# Altium footprint library SensorCard.PcbLib: 61 footprints (part 1 of 4)
Each footprint in its own frame and in the unit in brackets; x right, y up, seen from the top. Pads: shape width x height; smd on the part's side, far side on the other; paste and mask are expansions set on the pad; w line width, h text height; cw(c..) or ccw(c..) is an arc to the next point about the centre after c.
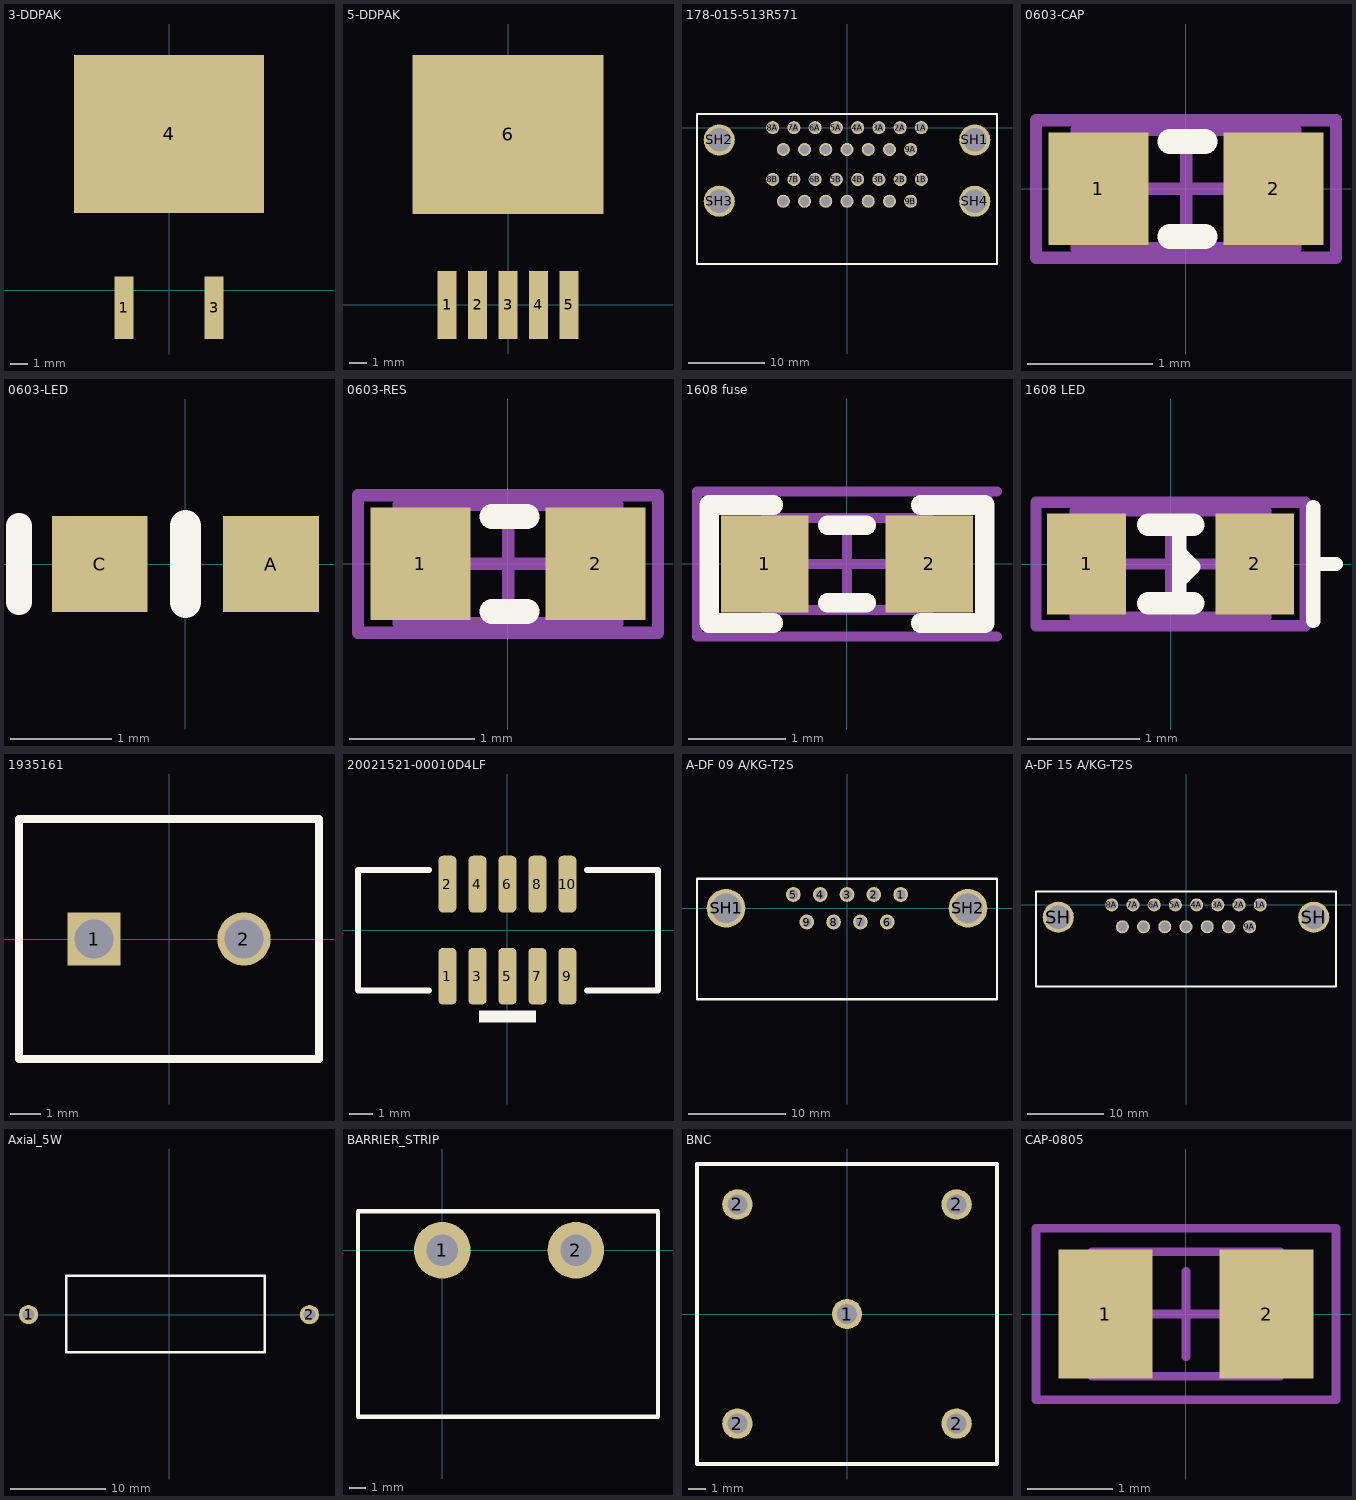
[diagram p0: the footprints below, top view; thin cyan lines are the x and y axes]

## 3-DDPAK [mil] "Q PACKAGE  3-LEAD PLASTIC DD"
height 7.09
pads (3):
  rect 42x137.95 smd: 1(-100,-39.37) 3(100,-39.37)
  rect 420x350 smd: 4(0,345)
3D body "TO-263-5.STEP": height 179.53, standoff 0, extent -200,-36.52 200,515.25

## 5-DDPAK [mil] "Q PACKAGE  5-LEAD PLASTIC DD"
height 7.09
pads (6):
  rect 42x150 smd: 1(-134,0) 2(-67,0) 3(0,0) 4(67,0) 5(134,0)
  rect 420x350 smd: 6(0,375)
3D body "TO-263-5.STEP": height 179.53, standoff 0, extent -200,-6.52 200,545.25

## 178-015-513R571 [mil] "CONN D-SUB RCPT 15POS R/A SLDR"
height 1250
pads (34):
  round 67 hole 47: 1A(381.5,0) 1B(381.5,-266) 2A(272.5,0) 2B(272.5,-266) 3A(163.5,0) 3B(163.5,-266) 4A(54.5,0) 4B(54.5,-266) 5A(-54.5,0) 5B(-54.5,-266) 6A(-163.5,0) 6B(-163.5,-266) 7A(-272.5,0) 7B(-272.5,-266) 8A(-381.5,0) 8B(-381.5,-266) 9A(327,-112) 9B(327,-378) 10A(218,-112) 10B(218,-378) 11A(109,-112) 11B(109,-378) 12A(0,-112) 12B(0,-378) 13A(-109,-112) 13B(-109,-378) 14A(-218,-112) 14B(-218,-378) 15A(-327,-112) 15B(-327,-378)
  round 160 hole 120: SH1(656,-63) SH2(-656,-63) SH3(-656,-378) SH4(656,-378)
Top Overlay:
  lines w10: -770,-700 770,-700 770,-63 770,30 770,70 -350,70 -500,70 -770,70 -770,-63 -770,-700
3D body "178-015-513.STEP": height 107.38, standoff -1268.62, extent -773.4,-938.49 774.6,62.51

## 0603-CAP [mm]
pads (2):
  rect 0.8x0.9 smd: 1(-0.7,0) 2(0.7,0)
Top Overlay:
  lines w0.2: -0.127,-0.381 0.152,-0.381 ; -0.127,0.381 0.152,0.381
Mechanical 13:
  lines w0.1: -0.875,-0.475 -0.875,0.475 0.875,0.475 0.875,-0.475 -0.875,-0.475
Mechanical 15:
  lines w0.1: -0.475,0 0.475,0 ; 0,-0.475 0,0.475 ; -1.2,-0.55 -1.2,0.55 1.2,0.55 1.2,-0.55 -1.2,-0.55
3D body "0603cap.step": height 0.79, standoff -0.01, extent -0.8,-0.4 0.8,0.4

## 0603-LED [mm]
pads (2):
  rect 0.95x0.95 smd: A(0.85,0) C(-0.85,0)
Top Overlay:
  lines w0.254: -1.651,-0.381 -1.651,0 -1.651,0.381
  lines w0.305: 0,-0.381 0,0 0,0.381
3D body "0603led.step": height 0.68, standoff 0, extent -0.833,-0.368 0.817,0.357
3D body: height 0.8, standoff -0.8, extent 0.051,0.813 0.051,0.813

## 0603-RES [mm]
pads (2):
  rect 0.8x0.9 smd: 1(-0.7,0) 2(0.7,0)
Top Overlay:
  lines w0.2: -0.127,-0.381 0.152,-0.381 ; -0.127,0.381 0.152,0.381
Mechanical 13:
  lines w0.1: -0.875,-0.475 -0.875,0.475 0.875,0.475 0.875,-0.475 -0.875,-0.475
Mechanical 15:
  lines w0.1: -0.475,0 0.475,0 ; 0,-0.475 0,0.475 ; -1.2,-0.55 -1.2,0.55 1.2,0.55 1.2,-0.55 -1.2,-0.55
3D body "0603res.step": height 0.44, standoff -0.02, extent -0.8,-0.381 0.8,0.419

## 1608 fuse [mm] "Fuse"
height 0.6
pads (2):
  rect 0.9x1 smd: 1(-0.85,0) 2(0.85,0)
Top Overlay:
  lines w0.2: -0.2,-0.4 0.2,-0.4 ; -0.2,0.4 0.2,0.4
  lines w0.203: -0.762,-0.61 -1.422,-0.61 -1.422,0.61 -0.762,0.61 ; 0.762,-0.61 1.422,-0.61 1.422,0.61 0.762,0.61
Mechanical 13:
  lines w0.1: -0.85,-0.475 -0.85,0.475 0.85,0.475 0.85,-0.475 -0.85,-0.475
Mechanical 15:
  lines w0.1: -0.475,0 0.475,0 ; 0,-0.475 0,0.475 ; 1.448,-0.75 1.448,0.75 ; 1.55,-0.75 -1.55,-0.75 -1.55,0.75 1.55,0.75
3D body: height 0.6, standoff 0, extent -0.85,-0.475 0.85,0.475

## 1608 LED [mm] "Chip LED, Body 1.6x0.8mm, IPC High Density"
height 0.6
pads (2):
  rect 0.7x0.9 smd: 1(-0.75,0) 2(0.75,0)
Top Overlay:
  lines w0.127: 0.076,0.102 0.203,-0.025 0.076,-0.152 0.076,-0.35 0.076,0.35 ; 1.27,0.508 1.27,-0.508 1.27,0 1.473,0
  lines w0.2: -0.2,-0.35 0.2,-0.35 ; -0.2,0.35 0.2,0.35
Mechanical 13:
  lines w0.1: -0.85,-0.475 0.85,-0.475 0.85,0.475 -0.85,0.475 -0.85,-0.475
Mechanical 15:
  lines w0.1: -0.475,0 0.475,0 ; 0,-0.475 0,0.475 ; -1.2,-0.55 1.2,-0.55 1.2,0.55 -1.2,0.55 -1.2,-0.55
3D body: height 0.6, standoff 0, extent -0.85,-0.475 0.85,0.475

## 1935161 [mm] "TERM BLOCK PCB 2POS 5.0MM GREEN"
height 11.4
pads (2):
  rect 1.778x1.778 hole 1.3: 1(-2.5,0)
  round 1.778 hole 1.3: 2(2.5,0)
Top Overlay:
  lines w0.254: -2.5,4 -5,4 -5,-4 -3,-4 ; 0,-4 -3,-4 ; 0,4 -3,4 3,4 5,4 5,-4 3,-4 -3,-4

## 20021521-00010D4LF [mm] "CONN HEADER SMD 10POS 1.27MM"
pads (10):
  rrect50% 0.76x2.4 smd: 1(-2.54,-1.95) 2(-2.54,1.95) 3(-1.27,-1.95) 4(-1.27,1.95) 5(0,-1.95) 6(0,1.95) 7(1.27,-1.95) 8(1.27,1.95) 9(2.54,-1.95) 10(2.54,1.95)
Top Overlay:
  rectangle: -1.2,-3.9 1.2,-3.4
  lines w0.254: -3.325,-2.55 -6.325,-2.55 -6.325,2.55 -3.325,2.55 ; 3.375,-2.55 6.375,-2.55 6.375,2.55 3.375,2.55
3D body "20021521-00010XXLFc.stp": height 5.65, standoff 0.05, extent -6.325,-2.75 6.325,2.75

## A-DF 09 A/KG-T2S [mm] "CONN D-SUB RCPT 9POS R/A SOLDER"
height 12.55
pads (11):
  round 1.524 hole 1: 1(5.54,1.42) 2(2.77,1.42) 3(0,1.42) 4(-2.77,1.42) 5(-5.54,1.42) 6(4.155,-1.42) 7(1.385,-1.42) 8(-1.385,-1.42) 9(-4.155,-1.42)
  round 4 hole 3.05: SH1(-12.495,0) SH2(12.495,0)
Top Overlay:
  lines w0.254: -15.494,-9.398 -15.494,0 -15.494,3.048 15.494,3.048 15.494,0 15.494,-9.398 -15.494,-9.398
3D body "connector_a-df_09_a_kg-t2.stp": height 12.57, standoff -4.3, extent -15.4,-15.325 15.41,2.975

## A-DF 15 A/KG-T2S [mil] "CONN D-SUB RCPT 15POS R/A SLDR"
height 1250
pads (17):
  round 67 hole 47: 1A(381.5,0) 2A(272.5,0) 3A(163.5,0) 4A(54.5,0) 5A(-54.5,0) 6A(-163.5,0) 7A(-272.5,0) 8A(-381.5,0) 9A(327,-112) 10A(218,-112) 11A(109,-112) 12A(0,-112) 13A(-109,-112) 14A(-218,-112) 15A(-327,-112)
  round 160 hole 120: SH(-656,-63) SH(656,-63)
Top Overlay:
  lines w10: 769.53,-420 -350.47,-420 -500.47,-420 -770.47,-420 -770,-63 -770,70 -500,70 -350,70 770,70 770,30 770,-63 770.47,-420
3D body "connector_a-df_15_a_kg-t2.stp": height 491.14, standoff -173.23, extent -770.47,-658.34 770.48,62.13

## Axial_5W [mm]
pads (2):
  round 2 hole 1.27: 1(-14.732,0) 2(14.732,0)
Top Overlay:
  lines w0.254: -10.795,-3.937 10.033,-3.937 10.033,4.064 -10.795,4.064 -10.795,-3.937
3D body: height 7.5, standoff 0, extent -10.381,-3.683 9.619,3.817

## BARRIER_STRIP [mm] "CONN BARRIER STRIP 2CIRC 0.325\""
pads (2):
  round 3.5 hole 1.93: 1(0,0) 2(8.26,0)
Top Overlay:
  lines w0.254: -5.207,-10.287 -5.207,2.413 13.335,2.413 13.335,-10.287 -5.207,-10.287
3D body "387007502.stp": height 12.7, standoff -3.56, extent -5.207,-10.287 13.335,2.413

## BNC [mil]
pads (5):
  round 70 hole 46: 1(0,0) 2(-252,-252) 2(-252,252) 2(252,-252) 2(252,252)
Top Overlay:
  lines w10: -345,-345 345,-345 345,345 -345,345 -345,-345
3D body "c-5227699-03-a-3d.stp": height 728.35, standoff -244.65, extent -343.5,-345 343.5,342

## CAP-0805 [mm] "Chip Capacitor, Body 2.0x1.3mm, IPC Medium Density"
height 1.1
pads (2):
  rect 1.1x1.5 smd: 1(-0.94,0) 2(0.94,0)
Mechanical 13:
  lines w0.1: -1.1,-0.725 1.1,-0.725 1.1,0.725 -1.1,0.725 -1.1,-0.725
Mechanical 15:
  lines w0.1: -0.5,0 0.5,0 ; 0,-0.5 0,0.5 ; -1.75,-1 1.75,-1 1.75,1 -1.75,1 -1.75,-1
3D body: height 1.1, standoff 0, extent -1.1,-0.725 1.1,0.725